# Altium footprint library Inductors SMD.PcbLib: 145 footprints (part 9 of 10)
Each footprint in its own frame and in the unit in brackets; x right, y up, seen from the top. Pads: shape width x height; smd on the part's side, far side on the other; paste and mask are expansions set on the pad; w line width, h text height; cw(c..) or ccw(c..) is an arc to the next point about the centre after c.
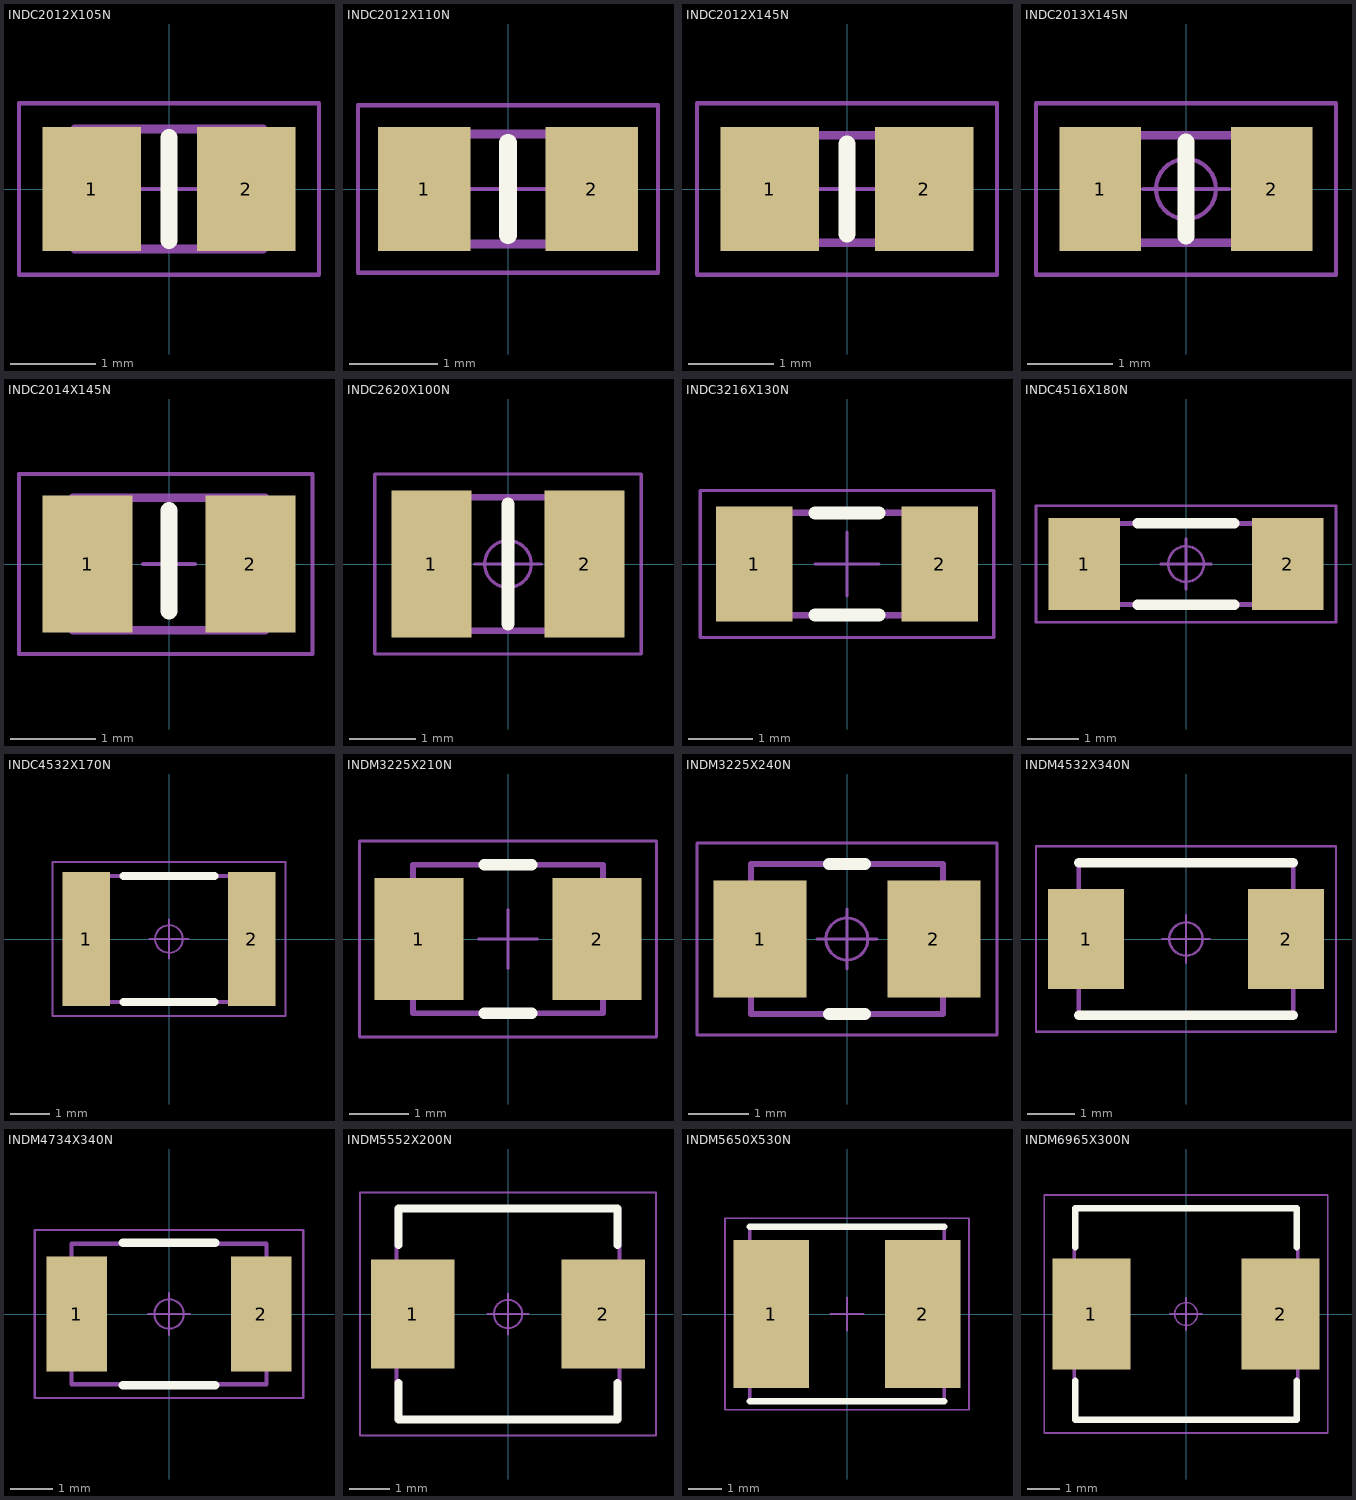
[diagram p8: the footprints below, top view; thin cyan lines are the x and y axes]

## INDC2012X105N [mm] "Chip Inductor, EIA 0805, Metric 2012, Body 2.0x1.25mm, IPC Medium Density"
height 1.05
pads (2):
  rect 1.15x1.45 smd: 1(-0.9,0) 2(0.9,0)
Top Overlay:
  lines w0.2: 0,-0.6 0,0.6
Mechanical 14:
  lines w0.1: -1.1,-0.7 -1.1,0.7 1.1,0.7 1.1,-0.7 -1.1,-0.7
Mechanical 15:
  lines w0.05: -0.5,0 0.5,0 ; 0,-0.5 0,0.5 ; -1.75,-1 -1.75,1 1.75,1 1.75,-1 -1.75,-1
3D body "INDC2012X110N.stp": height 1.1, standoff 0, extent -1.1,-0.7 1.1,0.7

## INDC2012X110N [mm] "Chip Inductor, EIA 0805, Metric 2012, Body 2.0x1.2mm, IPC Medium Density"
height 1.1
pads (2):
  rect 1.05x1.4 smd: 1(-0.95,0) 2(0.95,0)
Top Overlay:
  lines w0.2: 0,-0.525 0,0.525
Mechanical 14:
  lines w0.1: -1,-0.625 -1,0.625 1,0.625 1,-0.625 -1,-0.625
Mechanical 15:
  lines w0.05: -0.5,0 0.5,0 ; 0,-0.5 0,0.5 ; -1.7,-0.95 -1.7,0.95 1.7,0.95 1.7,-0.95 -1.7,-0.95
3D body "INDC2012X110N.stp": height 1.1, standoff 0, extent -1,-0.625 1,0.625

## INDC2012X145N [mm] "Chip Inductor, EIA 0805, Metric 2012, Body 2.0x1.25mm, IPC Medium Density"
height 1.45
pads (2):
  rect 1.15x1.45 smd: 1(-0.9,0) 2(0.9,0)
Top Overlay:
  lines w0.2: 0,-0.525 0,0.525
Mechanical 14:
  lines w0.1: -1,-0.625 1,-0.625 1,0.625 -1,0.625 -1,-0.625
Mechanical 15:
  lines w0.05: -0.5,0 0.5,0 ; 0,-0.5 0,0.5 ; -1.75,-1 1.75,-1 1.75,1 -1.75,1 -1.75,-1
3D body "INDC2012X145N.stp": height 1.45, standoff 0, extent -1,-0.625 1,0.625

## INDC2013X145N [mm] "Chip Inductor, EIA 0805, Metric 2012, Body 2.00mm L X 1.25mm W X 1.45mm H, IPC Medium Density"
height 1.45
pads (2):
  rect 0.95x1.45 smd: 1(-1,0) 2(1,0)
Top Overlay:
  lines w0.2: 0,-0.55 0,0.55
Mechanical 14:
  lines w0.1: -1,-0.625 -1,0.625 1,0.625 1,-0.625 -1,-0.625
Mechanical 15:
  circle w0.05: c0,0 r0.35
  lines w0.05: -0.5,0 0.5,0 ; 0,-0.5 0,0.5 ; -1.75,-1 -1.75,1 1.75,1 1.75,-1 -1.75,-1
3D body "INDC2013X145N.stp": height 1.45, standoff 0, extent -1,-0.625 1,0.625

## INDC2014X145N [mm] "Chip Inductor, EIA 0805, Metric 2014, Body 2.05x1.4mm, IPC Medium Density"
height 1.45
pads (2):
  rect 1.05x1.6 smd: 1(-0.95,0) 2(0.95,0)
Top Overlay:
  lines w0.2: 0,-0.55 0,0.625
Mechanical 14:
  lines w0.1: -1.125,-0.775 -1.125,0.775 ; -1.125,-0.775 1.125,-0.775 ; -1.125,-0.775 -1.125,0.775 ; -1.125,-0.775 1.125,-0.775 ; -1.125,0.775 1.125,0.775 ; -1.125,0.775 1.125,0.775 ; 1.125,-0.775 1.125,0.775 ; 1.125,-0.775 1.125,0.775
Mechanical 15:
  lines w0.05: -0.3,0 0.3,0 ; 0,-0.3 0,0.3 ; -1.75,-1.05 -1.75,1.05 1.675,1.05 1.675,-1.05 -1.75,-1.05
3D body "INDC2014X145N.stp": height 1.45, standoff 0, extent -0.995,-0.662 1.205,0.738

## INDC2620X100N [mm] "Chip Inductor, EIA 1008, Metric 2520, Body 2.60mm L X 2.00mm W X 1.00mm H, IPC Medium Density"
height 1
pads (2):
  rect 1.2x2.2 smd: 1(-1.15,0) 2(1.15,0)
Top Overlay:
  lines w0.2: 0,-0.9 0,0.9
Mechanical 14:
  lines w0.1: -1.3,-1 1.3,-1 1.3,1 -1.3,1 -1.3,-1
Mechanical 15:
  circle w0.05: c0,0 r0.35
  lines w0.05: -0.5,0 0.5,0 ; 0,-0.5 0,0.5 ; -2,-1.35 2,-1.35 2,1.35 -2,1.35 -2,-1.35
3D body "INDC2620X100N.stp": height 1, standoff 0, extent -1.3,-1 1.3,1

## INDC3216X130N [mm] "Chip Inductor, EIA 1206, Metric 3216, 3.20mm L X 1.60mm W, IPC Medium Density"
height 1.3
pads (2):
  rect 1.2x1.8 smd: 1(-1.45,0) 2(1.45,0)
Top Overlay:
  lines w0.2: -0.5,-0.8 0.5,-0.8 ; -0.5,0.8 0.5,0.8
Mechanical 14:
  lines w0.1: -1.6,-0.8 -1.6,0.8 1.6,0.8 1.6,-0.8 -1.6,-0.8
Mechanical 15:
  lines w0.05: -0.5,0 0.5,0 ; 0,-0.5 0,0.5 ; -2.3,-1.15 -2.3,1.15 2.3,1.15 2.3,-1.15 -2.3,-1.15
3D body "INDC3216X130N.stp": height 1.3, standoff 0, extent -1.7,-0.9 1.7,0.9

## INDC4516X180N [mm] "Inductor, Chip; 4.50mm L X 1.60mm W X 1.80mm H, IPC Medium Density"
height 1.8
pads (2):
  rect 1.4x1.8 smd: 1(-2,0) 2(2,0)
Top Overlay:
  lines w0.2: -0.95,-0.8 0.95,-0.8 ; -0.95,0.8 0.95,0.8
Mechanical 14:
  lines w0.1: -2.25,-0.8 -2.25,0.8 2.25,0.8 2.25,-0.8 -2.25,-0.8
Mechanical 15:
  circle w0.05: c0,0 r0.35
  circle w0.05: c0,0 r0.35
  lines w0.05: -2.95,-1.15 -2.95,1.15 ; -2.95,-1.15 2.95,-1.15 ; -2.95,-1.15 -2.95,1.15 ; -2.95,-1.15 2.95,-1.15 ; -2.95,1.15 2.95,1.15 ; -2.95,1.15 2.95,1.15 ; 2.95,-1.15 2.95,1.15 ; 2.95,-1.15 2.95,1.15 ; -0.5,0 0.5,0 -0.5,0 ; 0,-0.5 0,0.5 0,-0.5
3D body "INDC4516X180N.stp": height 1.8, standoff 0, extent -2.25,-0.8 2.25,0.8

## INDC4532X170N [mm] "Inductor, Chip;  4.50mm L X 3.20mm W X 1.70mm H, IPC Medium Density"
height 1.7
pads (2):
  rect 1.2x3.4 smd: 1(-2.1,0) 2(2.1,0)
Top Overlay:
  lines w0.2: -1.15,-1.6 1.15,-1.6 ; -1.15,1.6 1.15,1.6
Mechanical 14:
  lines w0.1: -2.25,-1.6 2.25,-1.6 2.25,1.6 -2.25,1.6 -2.25,-1.6
Mechanical 15:
  circle w0.05: c0,0 r0.35
  lines w0.05: -0.5,0 0.5,0 ; 0,-0.5 0,0.5 ; -2.95,-1.95 2.95,-1.95 2.95,1.95 -2.95,1.95 -2.95,-1.95
3D body "INDC4532X170N.stp": height 1.7, standoff 0, extent -2.35,-1.7 2.35,1.7

## INDM3225X210N [mm] "Inductor, Molded Body; 3.20mm L X 2.50mm W, IPC Medium Density"
height 2.1
pads (2):
  rect 1.5x2.05 smd: 1(-1.5,0) 2(1.5,0)
Top Overlay:
  lines w0.2: -0.4,-1.25 0.4,-1.25 ; -0.4,1.25 0.4,1.25
Mechanical 14:
  lines w0.1: -1.6,-1.25 1.6,-1.25 1.6,1.25 -1.6,1.25 -1.6,-1.25
Mechanical 15:
  lines w0.05: -0.5,0 0.5,0 ; 0,-0.5 0,0.5 ; -2.5,-1.65 2.5,-1.65 2.5,1.65 -2.5,1.65 -2.5,-1.65
3D body "INDM3225X210N.stp": height 2.1, standoff 0, extent -1.7,-1.35 1.7,1.35

## INDM3225X240N [mm] "Inductor, Molded Body; 3.20mm L X 2.50mm W, IPC Medium Density"
height 2.4
pads (2):
  rect 1.55x1.95 smd: 1(-1.45,0) 2(1.45,0)
Top Overlay:
  lines w0.2: -0.3,-1.25 0.3,-1.25 ; -0.3,1.25 0.3,1.25
Mechanical 14:
  lines w0.1: -1.6,-1.25 -1.6,1.25 1.6,1.25 1.6,-1.25 -1.6,-1.25
Mechanical 15:
  circle w0.05: c0,0 r0.35
  lines w0.05: -0.5,0 0.5,0 ; 0,-0.5 0,0.5 ; -2.5,-1.6 -2.5,1.6 2.5,1.6 2.5,-1.6 -2.5,-1.6
3D body "IND_EPCOS_B82422H.stp": height 2.4, standoff 0, extent -1.7,-1.35 1.7,1.35

## INDM4532X340N [mm] "Inductor, Molded Body; 4.5mm L X 3.2mm W, IPC Medium Density"
height 3.4
pads (2):
  rect 1.6x2.1 smd: 1(-2.1,0) 2(2.1,0)
Top Overlay:
  lines w0.2: -2.25,-1.6 2.25,-1.6 ; -2.25,1.6 2.25,1.6
Mechanical 14:
  lines w0.1: -2.25,-1.6 -2.25,1.6 2.25,1.6 2.25,-1.6 -2.25,-1.6
Mechanical 15:
  circle w0.05: c0,0 r0.35
  lines w0.05: -0.5,0 0.5,0 ; 0,-0.5 0,0.5 ; -3.15,-1.95 -3.15,1.95 3.15,1.95 3.15,-1.95 -3.15,-1.95
3D body "INDM4532X340N.stp": height 3.4, standoff 0, extent -2.25,-1.6 2.25,1.6

## INDM4734X340N [mm] "Inductor, Molded Body; 4.65mm L X 3.35mm W X 3.40mm H"
height 3.4
pads (2):
  rect 1.45x2.75 smd: 1(-2.2,0) 2(2.2,0)
Top Overlay:
  lines w0.2: -1.1,-1.7 1.1,-1.7 ; -1.1,1.7 1.1,1.7
Mechanical 14:
  lines w0.1: -2.325,-1.675 -2.325,1.675 2.325,1.675 2.325,-1.675 -2.325,-1.675
Mechanical 15:
  circle w0.05: c0,0 r0.35
  lines w0.05: -0.5,0 0.5,0 ; 0,-0.5 0,0.5 ; -3.2,-2 -3.2,2 3.2,2 3.2,-2 -3.2,-2
3D body "INDM4734X340N.stp": height 3.4, standoff 0, extent -2.35,-1.75 2.35,1.75

## INDM5552X200N [mm] "Inductor, Molded Body; 5.49mm L X 5.18mm W X 2.00mm H, IPC Medium Density"
height 2
pads (2):
  rect 2.05x2.7 smd: 1(-2.35,0) 2(2.35,0)
Top Overlay:
  lines w0.2: -2.7,-1.7 -2.7,-2.6 2.7,-2.6 2.7,-1.7 ; -2.7,1.7 -2.7,2.6 2.7,2.6 2.7,1.7
Mechanical 14:
  lines w0.1: -2.745,-2.59 2.745,-2.59 2.745,2.59 -2.745,2.59 -2.745,-2.59
Mechanical 15:
  circle w0.05: c0,0 r0.35
  lines w0.05: -0.5,0 0.5,0 ; 0,-0.5 0,0.5 ; -3.65,-3 3.65,-3 3.65,3 -3.65,3 -3.65,-3
3D body "INDM5552X200N.stp": height 2, standoff 0, extent -2.745,-2.59 2.745,2.59

## INDM5650X530N [mm] "Molded Inductor, 2-Leads, Body 5.6x5.0mm, IPC Medium Density"
height 5.3
pads (2):
  rect 2.3x4.5 smd: 1(-2.3,0) 2(2.3,0)
Top Overlay:
  lines w0.2: -2.95,-2.65 2.95,-2.65 ; -2.95,2.65 2.95,2.65
Mechanical 14:
  lines w0.1: -2.95,-2.65 2.95,-2.65 2.95,2.65 -2.95,2.65 -2.95,-2.65
Mechanical 15:
  lines w0.05: -0.5,0 0.5,0 ; 0,-0.5 0,0.5 ; -3.7,-2.9 3.7,-2.9 3.7,2.9 -3.7,2.9 -3.7,-2.9
3D body "INDM5650X530N.stp": height 5.3, standoff 0, extent -2.95,-2.65 2.85,2.65

## INDM6965X300N [mm] "Inductor Molded Body, Body 6.86mm L X 6.47mm W X 3mm H, IPC Medium Density"
height 3
pads (2):
  rect 2.4x3.4 smd: 1(-2.9,0) 2(2.9,0)
Top Overlay:
  lines w0.2: -3.4,-2.05 -3.4,-3.25 3.4,-3.25 3.4,-2.05 ; -3.4,2.05 -3.4,3.25 3.4,3.25 3.4,2.05
Mechanical 14:
  lines w0.1: -3.43,-3.235 3.43,-3.235 3.43,3.235 -3.43,3.235 -3.43,-3.235
Mechanical 15:
  circle w0.05: c0,0 r0.35
  lines w0.05: -0.5,0 0.5,0 ; 0,-0.5 0,0.5 ; -4.35,-3.65 4.35,-3.65 4.35,3.65 -4.35,3.65 -4.35,-3.65
3D body "INDM_VISHAY_IHLP2525CZ.stp": height 3, standoff 0, extent -3.62,-3.36 3.62,3.36